# Altium footprint library UD2 CPLD.PcbLib: 43 footprints (part 1 of 3)
Each footprint in its own frame and in the unit in brackets; x right, y up, seen from the top. Pads: shape width x height; smd on the part's side, far side on the other; paste and mask are expansions set on the pad; w line width, h text height; cw(c..) or ccw(c..) is an arc to the next point about the centre after c.
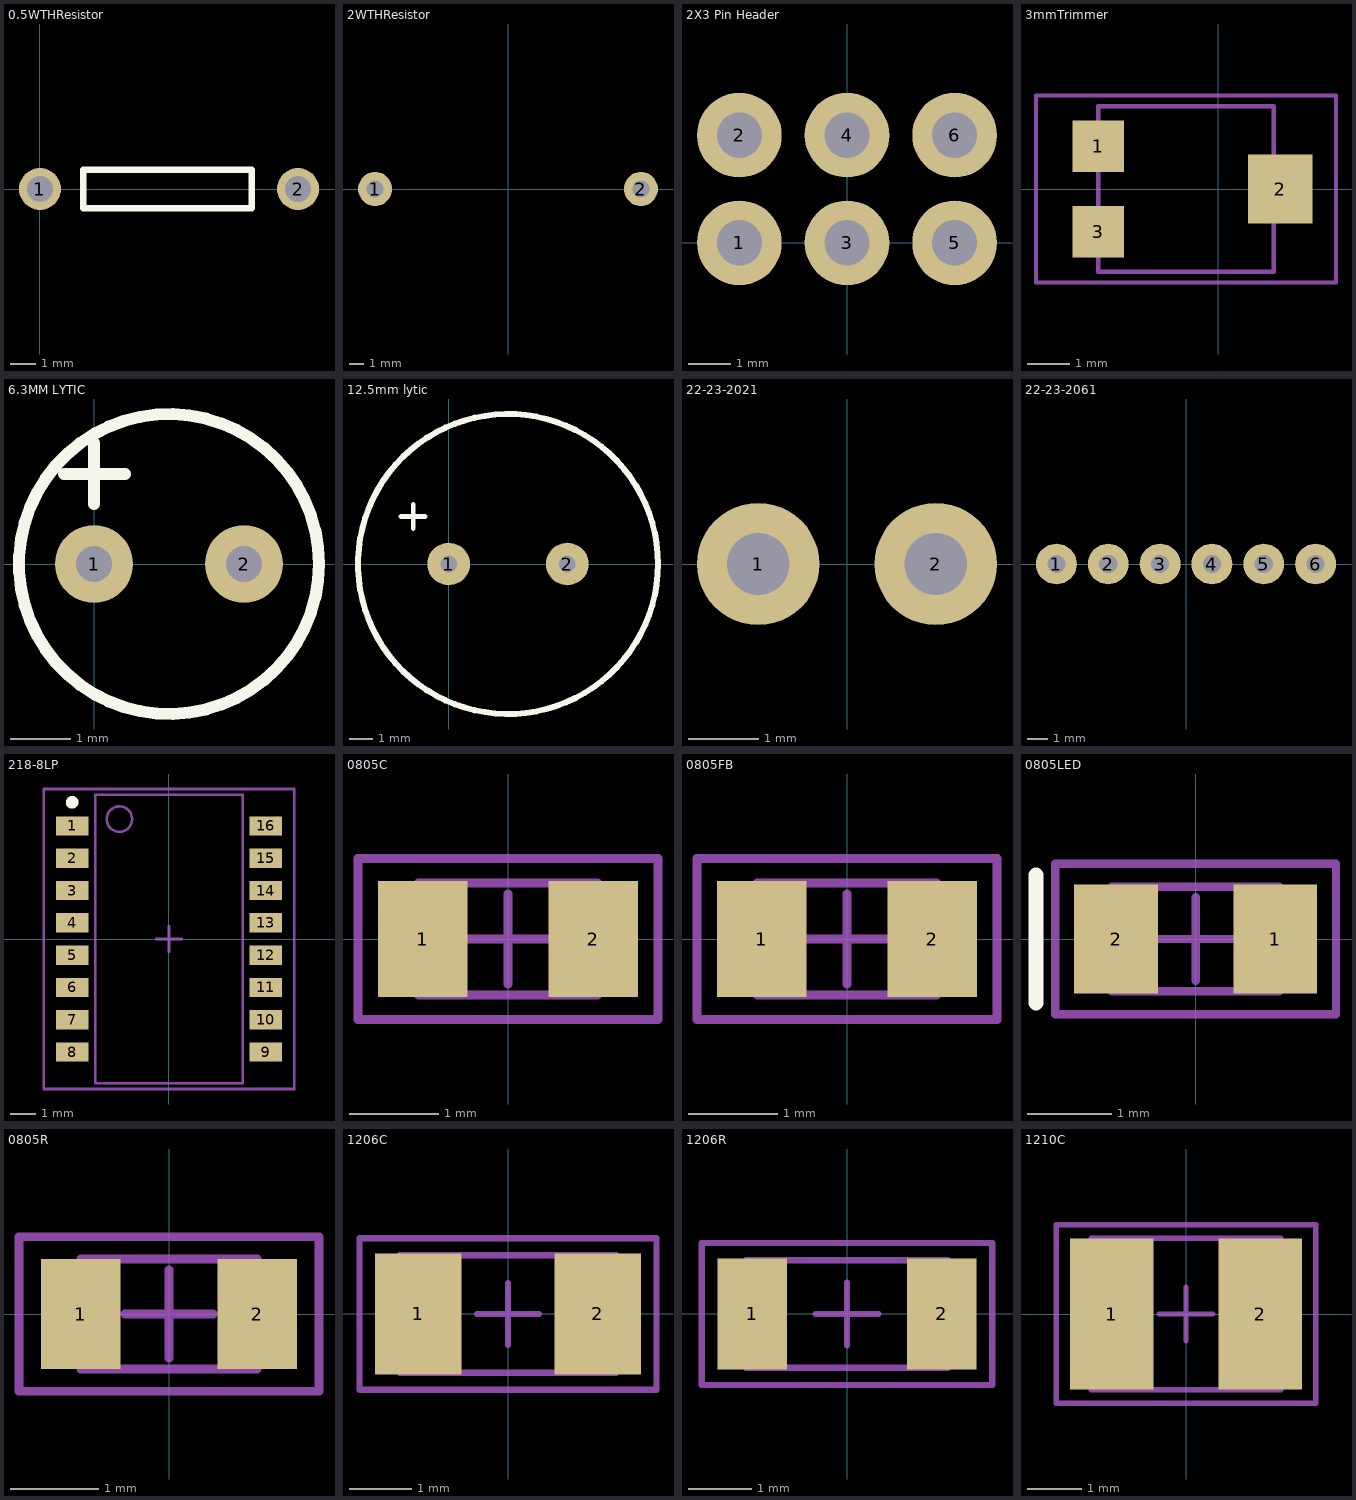
[diagram p0: the footprints below, top view; thin cyan lines are the x and y axes]

## 0.5WTHResistor [mil]
pads (2):
  round 65 hole 40: 1(0,0) 2(400,0)
Top Overlay:
  lines w10: 67,-29.93 67,30.07 328,30.07 328,-29.93 67,-29.93
3D body: height 130.71, standoff -78.74, extent -13.78,-64.96 413.78,64.96

## 2WTHResistor [mil]
pads (2):
  round 90 hole 45: 1(-350,0) 2(350,0)
3D body: height 217.48, standoff -68.74, extent -365.94,-109.18 365.94,107.35

## 2X3 Pin Header [mm]
pads (6):
  round 2 hole 1.067: 1(-2.54,0) 2(-2.54,2.54) 3(0,0) 4(0,2.54) 5(2.54,0) 6(2.54,2.54)
3D body: height 8.38, standoff -3.81, extent -3.81,-1.27 3.81,3.81

## 3mmTrimmer [mm]
pads (3):
  rect 1.2x1.2 smd: 1(-2.8,1) 3(-2.8,-1)
  rect 1.5x1.6 smd: 2(1.45,0)
Mechanical 13:
  lines w0.1: -2.8,-1.93 -2.8,1.93 1.3,1.93 1.3,-1.93 -2.8,-1.93
Mechanical 15:
  lines w0.1: -4.25,-2.18 -4.25,2.18 2.75,2.18 2.75,-2.18 -4.25,-2.18
3D body: height 1.13, standoff -0.02, extent -2.731,-1.8 1.231,1.8

## 6.3MM LYTIC [mm]
pads (2):
  round 1.3 hole 0.6: 1(0,0) 2(2.5,0)
Top Overlay:
  circle w0.2: c1.25,0 r2.5
  lines w0.2: -0.5,1.5 0.516,1.5 ; 0,1 0,2.016
3D body: height 11.53, standoff -3.01, extent -1.925,-3.175 4.425,3.175

## 12.5mm lytic [mm]
pads (2):
  round 1.8 hole 0.7: 1(0,0) 2(5,0)
Top Overlay:
  circle w0.254: c2.5,0 r6.325
  lines w0.2: -2.016,2 -1,2 ; -1.5,1.5 -1.5,2.516
3D body: height 20.5, standoff -3.5, extent -3.75,-6.25 8.752,6.211

## 22-23-2021 [mm]
pads (2):
  round 1.75 hole 0.889: 1(-1.27,0) 2(1.27,0)
3D body: height 10.58, standoff -3.64, extent -2.464,-3.251 2.464,3.099

## 22-23-2061 [mm]
pads (6):
  round 2 hole 0.889: 1(-6.35,0) 2(-3.81,0) 3(-1.27,0) 4(1.27,0) 5(3.81,0) 6(6.35,0)
3D body: height 10.58, standoff -3.64, extent -7.544,-3.251 7.544,3.099

## 218-8LP [mm]
pads (16):
  rect 1.27x0.76 smd: 1(-3.81,4.445) 2(-3.81,3.175) 3(-3.81,1.905) 4(-3.81,0.635) 5(-3.81,-0.635) 6(-3.81,-1.905) 7(-3.81,-3.175) 8(-3.81,-4.445) 9(3.81,-4.445) 10(3.81,-3.175) 11(3.81,-1.905) 12(3.81,-0.635) 13(3.81,0.635) 14(3.81,1.905) 15(3.81,3.175) 16(3.81,4.445)
Top Overlay:
  circle w0.25: c-3.81,5.375 r0.125
Mechanical 13:
  circle w0.1: c-1.95,4.715 r0.5
  lines w0.1: -2.9,-5.665 2.9,-5.665 2.9,5.665 -2.9,5.665 -2.9,-5.665
Mechanical 15:
  lines w0.1: -0.5,0 0.5,0 ; 0,-0.5 0,0.5 ; -4.925,-5.9 4.925,-5.9 4.925,5.9 -4.925,5.9 -4.925,-5.9
3D body: height 2.4, standoff 0, extent -4.1,-5.65 4.1,5.65

## 0805C [mm]
pads (2):
  rect 1x1.3 smd: 1(-0.95,0) 2(0.95,0)
Mechanical 13:
  lines w0.1: -0.5,0 0.5,0 ; 0,-0.5 0,0.5 ; -1.675,-0.9 1.675,-0.9 1.675,0.9 -1.675,0.9 -1.675,-0.9 ; -1,-0.625 1,-0.625 1,0.625 -1,0.625 -1,-0.625
3D body: height 0.57, standoff 0, extent -1.004,-0.604 0.997,0.666

## 0805FB [mm]
pads (2):
  rect 1x1.3 smd: 1(-0.95,0) 2(0.95,0)
Mechanical 13:
  lines w0.1: -0.5,0 0.5,0 ; 0,-0.5 0,0.5 ; -1.675,-0.9 -1.675,0.9 1.675,0.9 1.675,-0.9 -1.675,-0.9 ; -1,-0.625 -1,0.625 1,0.625 1,-0.625 -1,-0.625
3D body: height 0.85, standoff 0, extent -1.004,-0.604 0.997,0.646

## 0805LED [mm]
pads (2):
  rect 1x1.3 smd: 1(0.95,0) 2(-0.95,0)
Top Overlay:
  lines w0.178: -1.905,-0.762 -1.905,0.762
Mechanical 13:
  lines w0.1: -0.5,0 0.5,0 ; 0,-0.5 0,0.5 ; -1.675,-0.9 1.675,-0.9 1.675,0.9 -1.675,0.9 -1.675,-0.9 ; -1,-0.625 1,-0.625 1,0.625 -1,0.625 -1,-0.625
3D body: height 0.7, standoff 0.3, extent -0.704,-0.604 0.697,0.646
3D body: height 0.64, standoff 0, extent -1.004,-0.604 0.997,0.646

## 0805R [mm]
pads (2):
  rect 0.9x1.25 smd: 1(-1,0) 2(1,0)
Mechanical 13:
  lines w0.1: -0.5,0 0.5,0 ; 0,-0.5 0,0.5 ; -1.7,-0.875 -1.7,0.875 1.7,0.875 1.7,-0.875 -1.7,-0.875 ; -1,-0.625 -1,0.625 1,0.625 1,-0.625 -1,-0.625
3D body: height 0.5, standoff 0, extent -0.999,-0.619 1.001,0.631

## 1206C [mm]
pads (2):
  rect 1.4x1.95 smd: 1(-1.45,0) 2(1.45,0)
Mechanical 13:
  lines w0.1: -1.75,-0.95 -1.75,0.95 1.75,0.95 1.75,-0.95 -1.75,-0.95
Mechanical 15:
  lines w0.1: -0.5,0 0.5,0 ; 0,-0.5 0,0.5 ; -2.4,-1.225 -2.4,1.225 2.4,1.225 2.4,-1.225 -2.4,-1.225
3D body: height 0.94, standoff 0, extent -1.6,-0.8 1.6,0.8

## 1206R [mm]
pads (2):
  rect 1.1x1.75 smd: 1(-1.5,0) 2(1.5,0)
Mechanical 13:
  lines w0.1: -1.6,-0.85 -1.6,0.85 1.6,0.85 1.6,-0.85 -1.6,-0.85
Mechanical 15:
  lines w0.1: -0.5,0 0.5,0 ; 0,-0.5 0,0.5 ; -2.3,-1.125 -2.3,1.125 2.3,1.125 2.3,-1.125 -2.3,-1.125
3D body: height 0.6, standoff 0, extent -1.6,-0.8 1.6,0.8

## 1210C [mm]
pads (2):
  rect 1.55x2.8 smd: 1(-1.375,0) 2(1.375,0)
Mechanical 13:
  lines w0.1: -1.75,-1.4 -1.75,1.4 1.75,1.4 1.75,-1.4 -1.75,-1.4
Mechanical 15:
  lines w0.1: -0.5,0 0.5,0 ; 0,-0.5 0,0.5 ; -2.4,-1.65 -2.4,1.65 2.4,1.65 2.4,-1.65 -2.4,-1.65
3D body: height 2.5, standoff 0, extent -1.6,-1.25 1.6,1.25